# Altium schematic symbol library jlcpcb_2025_04_capacitors_extended_0603.schlib: 3668 symbols (part 8 of 20) (continued)
## CC0603FRNPO0BN120
designator C?  Capacitance: 12pF  (hidden comment: *)
Capacitor, Ceramic (MLCC), 12pF, ±1%, 100V, NP0, ±1%, SMD 0603; Manufacturer: YAGEO; Manufacturer Part Number: CC0603FRNPO0BN120; Package Size: 0603; JLCPCB Basic Part: No; JLCPCB Part Number: C576767; Supplier 1: LCSC; Category: Capacitors - MLCC; Supplier Part Number 1: C576767; Tolerance: ±1%; Voltage Rating: 100V; Temperature Coefficient: NP0; RoHS: Yes; ComponentLink1Description: Datasheet; ComponentLink1URL: https://wmsc.lcsc.com/wmsc/upload/file/pdf/v2/lcsc/2311211121_YAGEO-CC0603FRNPO0BN120_C576767.pdf; ComponentLink2Description: JLCPCB Part URL; ComponentLink2URL: https://jlcpcb.com/partdetail/C576767; ComponentLink3Description: LCSC Part URL; ComponentLink3URL: https://lcsc.com/product-detail/Multilayer-Ceramic-Capacitors-MLCC---SMD-SMT_YAGEO-YAGEO-CC0603FRNPO0BN120_C576767.html
footprint CAP-0603 (0603 (1608M) Capacitor)
pins: 1, 2

## CC0603FRNPO0BN121
designator C?  Capacitance: 120pF  (hidden comment: *)
Capacitor, Ceramic (MLCC), 120pF, ±1%, 100V, NP0, ±1%, SMD 0603; Manufacturer: YAGEO; Manufacturer Part Number: CC0603FRNPO0BN121; Package Size: 0603; JLCPCB Basic Part: No; JLCPCB Part Number: C576768; Supplier 1: LCSC; Category: Capacitors - MLCC; Supplier Part Number 1: C576768; Tolerance: ±1%; Voltage Rating: 100V; Temperature Coefficient: NP0; RoHS: Yes; ComponentLink1Description: Datasheet; ComponentLink1URL: https://wmsc.lcsc.com/wmsc/upload/file/pdf/v2/lcsc/2311211121_YAGEO-CC0603FRNPO0BN121_C576768.pdf; ComponentLink2Description: JLCPCB Part URL; ComponentLink2URL: https://jlcpcb.com/partdetail/C576768; ComponentLink3Description: LCSC Part URL; ComponentLink3URL: https://lcsc.com/product-detail/Multilayer-Ceramic-Capacitors-MLCC---SMD-SMT_YAGEO-YAGEO-CC0603FRNPO0BN121_C576768.html
footprint CAP-0603 (0603 (1608M) Capacitor)
pins: 1, 2

## CC0603FRNPO0BN150
designator C?  Capacitance: 15pF  (hidden comment: *)
Capacitor, Ceramic (MLCC), 15pF, ±1%, 100V, NP0, ±1%, SMD 0603; Manufacturer: YAGEO; Manufacturer Part Number: CC0603FRNPO0BN150; Package Size: 0603; JLCPCB Basic Part: No; JLCPCB Part Number: C527040; Supplier 1: LCSC; Category: Capacitors - MLCC; Supplier Part Number 1: C527040; Tolerance: ±1%; Voltage Rating: 100V; Temperature Coefficient: NP0; RoHS: Yes; ComponentLink1Description: Datasheet; ComponentLink1URL: https://wmsc.lcsc.com/wmsc/upload/file/pdf/v2/lcsc/2006181534_YAGEO-CC0603FRNPO0BN150_C527040.pdf; ComponentLink2Description: JLCPCB Part URL; ComponentLink2URL: https://jlcpcb.com/partdetail/C527040; ComponentLink3Description: LCSC Part URL; ComponentLink3URL: https://lcsc.com/product-detail/Multilayer-Ceramic-Capacitors-MLCC---SMD-SMT_YAGEO-YAGEO-CC0603FRNPO0BN150_C527040.html
footprint CAP-0603 (0603 (1608M) Capacitor)
pins: 1, 2

## CC0603FRNPO0BN151
designator C?  Capacitance: 150pF  (hidden comment: *)
Capacitor, Ceramic (MLCC), 150pF, ±1%, 100V, NP0, ±1%, SMD 0603; Manufacturer: YAGEO; Manufacturer Part Number: CC0603FRNPO0BN151; Package Size: 0603; JLCPCB Basic Part: No; JLCPCB Part Number: C527041; Supplier 1: LCSC; Category: Capacitors - MLCC; Supplier Part Number 1: C527041; Tolerance: ±1%; Voltage Rating: 100V; Temperature Coefficient: NP0; RoHS: Yes; ComponentLink1Description: Datasheet; ComponentLink1URL: https://wmsc.lcsc.com/wmsc/upload/file/pdf/v2/lcsc/2007021836_YAGEO-CC0603FRNPO0BN151_C527041.pdf; ComponentLink2Description: JLCPCB Part URL; ComponentLink2URL: https://jlcpcb.com/partdetail/C527041; ComponentLink3Description: LCSC Part URL; ComponentLink3URL: https://lcsc.com/product-detail/Multilayer-Ceramic-Capacitors-MLCC---SMD-SMT_YAGEO-YAGEO-CC0603FRNPO0BN151_C527041.html
footprint CAP-0603 (0603 (1608M) Capacitor)
pins: 1, 2

## CC0603FRNPO0BN180
designator C?  Capacitance: 18pF  (hidden comment: *)
Capacitor, Ceramic (MLCC), 18pF, ±1%, 100V, NP0, ±1%, SMD 0603; Manufacturer: YAGEO; Manufacturer Part Number: CC0603FRNPO0BN180; Package Size: 0603; JLCPCB Basic Part: No; JLCPCB Part Number: C576769; Supplier 1: LCSC; Category: Capacitors - MLCC; Supplier Part Number 1: C576769; Tolerance: ±1%; Voltage Rating: 100V; Temperature Coefficient: NP0; RoHS: Yes; ComponentLink1Description: Datasheet; ComponentLink1URL: https://wmsc.lcsc.com/wmsc/upload/file/pdf/v2/lcsc/2311211121_YAGEO-CC0603FRNPO0BN180_C576769.pdf; ComponentLink2Description: JLCPCB Part URL; ComponentLink2URL: https://jlcpcb.com/partdetail/C576769; ComponentLink3Description: LCSC Part URL; ComponentLink3URL: https://lcsc.com/product-detail/Multilayer-Ceramic-Capacitors-MLCC---SMD-SMT_YAGEO-YAGEO-CC0603FRNPO0BN180_C576769.html
footprint CAP-0603 (0603 (1608M) Capacitor)
pins: 1, 2

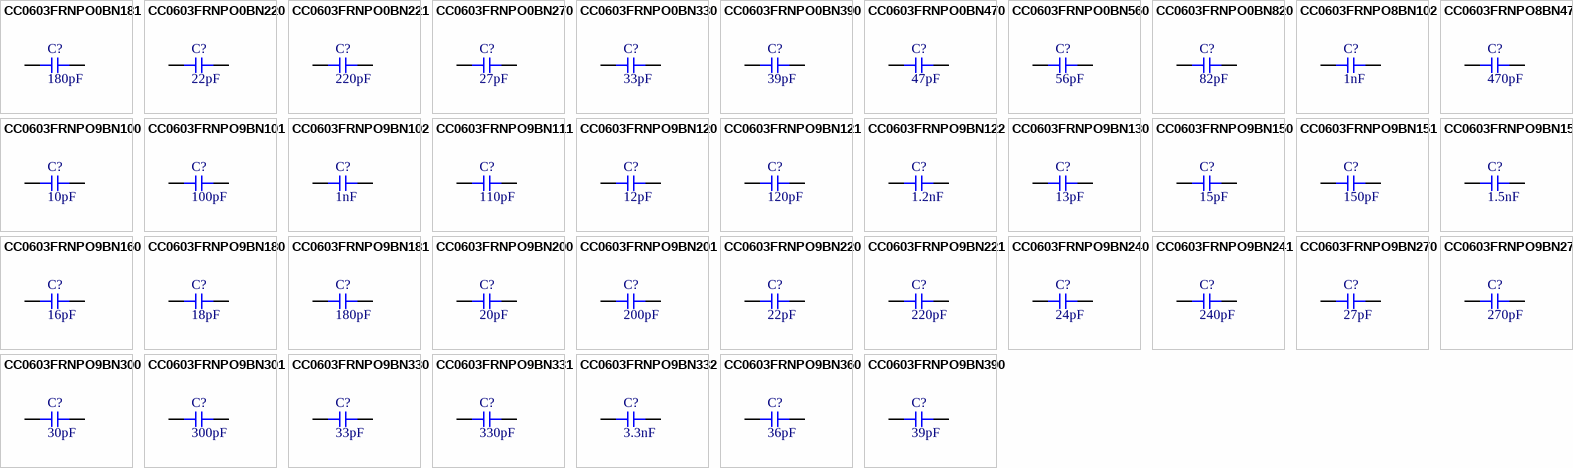
[diagram p36: symbols CC0603FRNPO0BN181 to CC0603FRNPO9BN390]

## CC0603FRNPO0BN181
designator C?  Capacitance: 180pF  (hidden comment: *)
Capacitor, Ceramic (MLCC), 180pF, ±1%, 100V, NP0, ±1%, SMD 0603; Manufacturer: YAGEO; Manufacturer Part Number: CC0603FRNPO0BN181; Package Size: 0603; JLCPCB Basic Part: No; JLCPCB Part Number: C576770; Supplier 1: LCSC; Category: Capacitors - MLCC; Supplier Part Number 1: C576770; Tolerance: ±1%; Voltage Rating: 100V; Temperature Coefficient: NP0; RoHS: Yes; ComponentLink1Description: Datasheet; ComponentLink1URL: https://wmsc.lcsc.com/wmsc/upload/file/pdf/v2/lcsc/2211141030_YAGEO-CC0603FRNPO0BN181_C576770.pdf; ComponentLink2Description: JLCPCB Part URL; ComponentLink2URL: https://jlcpcb.com/partdetail/C576770; ComponentLink3Description: LCSC Part URL; ComponentLink3URL: https://lcsc.com/product-detail/Multilayer-Ceramic-Capacitors-MLCC---SMD-SMT_YAGEO-YAGEO-CC0603FRNPO0BN181_C576770.html
footprint CAP-0603 (0603 (1608M) Capacitor)
pins: 1, 2

## CC0603FRNPO0BN220
designator C?  Capacitance: 22pF  (hidden comment: *)
Capacitor, Ceramic (MLCC), 22pF, ±1%, 100V, NP0, ±1%, SMD 0603; Manufacturer: YAGEO; Manufacturer Part Number: CC0603FRNPO0BN220; Package Size: 0603; JLCPCB Basic Part: No; JLCPCB Part Number: C527042; Supplier 1: LCSC; Category: Capacitors - MLCC; Supplier Part Number 1: C527042; Tolerance: ±1%; Voltage Rating: 100V; Temperature Coefficient: NP0; RoHS: Yes; ComponentLink1Description: Datasheet; ComponentLink1URL: https://wmsc.lcsc.com/wmsc/upload/file/pdf/v2/lcsc/2006181534_YAGEO-CC0603FRNPO0BN220_C527042.pdf; ComponentLink2Description: JLCPCB Part URL; ComponentLink2URL: https://jlcpcb.com/partdetail/C527042; ComponentLink3Description: LCSC Part URL; ComponentLink3URL: https://lcsc.com/product-detail/Multilayer-Ceramic-Capacitors-MLCC---SMD-SMT_YAGEO-YAGEO-CC0603FRNPO0BN220_C527042.html
footprint CAP-0603 (0603 (1608M) Capacitor)
pins: 1, 2

## CC0603FRNPO0BN221
designator C?  Capacitance: 220pF  (hidden comment: *)
Capacitor, Ceramic (MLCC), 220pF, ±1%, 100V, NP0, ±1%, SMD 0603; Manufacturer: YAGEO; Manufacturer Part Number: CC0603FRNPO0BN221; Package Size: 0603; JLCPCB Basic Part: No; JLCPCB Part Number: C576771; Supplier 1: LCSC; Category: Capacitors - MLCC; Supplier Part Number 1: C576771; Tolerance: ±1%; Voltage Rating: 100V; Temperature Coefficient: NP0; RoHS: Yes; ComponentLink1Description: Datasheet; ComponentLink1URL: https://wmsc.lcsc.com/wmsc/upload/file/pdf/v2/lcsc/2311211121_YAGEO-CC0603FRNPO0BN221_C576771.pdf; ComponentLink2Description: JLCPCB Part URL; ComponentLink2URL: https://jlcpcb.com/partdetail/C576771; ComponentLink3Description: LCSC Part URL; ComponentLink3URL: https://lcsc.com/product-detail/Multilayer-Ceramic-Capacitors-MLCC---SMD-SMT_YAGEO-YAGEO-CC0603FRNPO0BN221_C576771.html
footprint CAP-0603 (0603 (1608M) Capacitor)
pins: 1, 2

## CC0603FRNPO0BN270
designator C?  Capacitance: 27pF  (hidden comment: *)
Capacitor, Ceramic (MLCC), 27pF, ±1%, 100V, NP0, ±1%, SMD 0603; Manufacturer: YAGEO; Manufacturer Part Number: CC0603FRNPO0BN270; Package Size: 0603; JLCPCB Basic Part: No; JLCPCB Part Number: C576772; Supplier 1: LCSC; Category: Capacitors - MLCC; Supplier Part Number 1: C576772; Tolerance: ±1%; Voltage Rating: 100V; Temperature Coefficient: NP0; RoHS: Yes; ComponentLink1Description: Datasheet; ComponentLink1URL: https://wmsc.lcsc.com/wmsc/upload/file/pdf/v2/lcsc/2211141030_YAGEO-CC0603FRNPO0BN270_C576772.pdf; ComponentLink2Description: JLCPCB Part URL; ComponentLink2URL: https://jlcpcb.com/partdetail/C576772; ComponentLink3Description: LCSC Part URL; ComponentLink3URL: https://lcsc.com/product-detail/Multilayer-Ceramic-Capacitors-MLCC---SMD-SMT_YAGEO-YAGEO-CC0603FRNPO0BN270_C576772.html
footprint CAP-0603 (0603 (1608M) Capacitor)
pins: 1, 2

## CC0603FRNPO0BN330
designator C?  Capacitance: 33pF  (hidden comment: *)
Capacitor, Ceramic (MLCC), 33pF, ±1%, 100V, NP0, ±1%, SMD 0603; Manufacturer: YAGEO; Manufacturer Part Number: CC0603FRNPO0BN330; Package Size: 0603; JLCPCB Basic Part: No; JLCPCB Part Number: C527043; Supplier 1: LCSC; Category: Capacitors - MLCC; Supplier Part Number 1: C527043; Tolerance: ±1%; Voltage Rating: 100V; Temperature Coefficient: NP0; RoHS: Yes; ComponentLink1Description: Datasheet; ComponentLink1URL: https://wmsc.lcsc.com/wmsc/upload/file/pdf/v2/lcsc/2304140030_YAGEO-CC0603FRNPO0BN330_C527043.pdf; ComponentLink2Description: JLCPCB Part URL; ComponentLink2URL: https://jlcpcb.com/partdetail/C527043; ComponentLink3Description: LCSC Part URL; ComponentLink3URL: https://lcsc.com/product-detail/Multilayer-Ceramic-Capacitors-MLCC---SMD-SMT_YAGEO-YAGEO-CC0603FRNPO0BN330_C527043.html
footprint CAP-0603 (0603 (1608M) Capacitor)
pins: 1, 2

## CC0603FRNPO0BN390
designator C?  Capacitance: 39pF  (hidden comment: *)
Capacitor, Ceramic (MLCC), 39pF, ±1%, 100V, NP0, ±1%, SMD 0603; Manufacturer: YAGEO; Manufacturer Part Number: CC0603FRNPO0BN390; Package Size: 0603; JLCPCB Basic Part: No; JLCPCB Part Number: C576774; Supplier 1: LCSC; Category: Capacitors - MLCC; Supplier Part Number 1: C576774; Tolerance: ±1%; Voltage Rating: 100V; Temperature Coefficient: NP0; RoHS: Yes; ComponentLink1Description: Datasheet; ComponentLink1URL: https://wmsc.lcsc.com/wmsc/upload/file/pdf/v2/lcsc/2303021100_YAGEO-CC0603FRNPO0BN390_C576774.pdf; ComponentLink2Description: JLCPCB Part URL; ComponentLink2URL: https://jlcpcb.com/partdetail/C576774; ComponentLink3Description: LCSC Part URL; ComponentLink3URL: https://lcsc.com/product-detail/Multilayer-Ceramic-Capacitors-MLCC---SMD-SMT_YAGEO-YAGEO-CC0603FRNPO0BN390_C576774.html
footprint CAP-0603 (0603 (1608M) Capacitor)
pins: 1, 2

## CC0603FRNPO0BN470
designator C?  Capacitance: 47pF  (hidden comment: *)
Capacitor, Ceramic (MLCC), 47pF, ±1%, 100V, NP0, ±1%, SMD 0603; Manufacturer: YAGEO; Manufacturer Part Number: CC0603FRNPO0BN470; Package Size: 0603; JLCPCB Basic Part: No; JLCPCB Part Number: C527044; Supplier 1: LCSC; Category: Capacitors - MLCC; Supplier Part Number 1: C527044; Tolerance: ±1%; Voltage Rating: 100V; Temperature Coefficient: NP0; RoHS: Yes; ComponentLink1Description: Datasheet; ComponentLink1URL: https://wmsc.lcsc.com/wmsc/upload/file/pdf/v2/lcsc/2006101834_YAGEO-CC0603FRNPO0BN470_C527044.pdf; ComponentLink2Description: JLCPCB Part URL; ComponentLink2URL: https://jlcpcb.com/partdetail/C527044; ComponentLink3Description: LCSC Part URL; ComponentLink3URL: https://lcsc.com/product-detail/Multilayer-Ceramic-Capacitors-MLCC---SMD-SMT_YAGEO-YAGEO-CC0603FRNPO0BN470_C527044.html
footprint CAP-0603 (0603 (1608M) Capacitor)
pins: 1, 2

## CC0603FRNPO0BN560
designator C?  Capacitance: 56pF  (hidden comment: *)
Capacitor, Ceramic (MLCC), 56pF, ±1%, 100V, NP0, ±1%, SMD 0603; Manufacturer: YAGEO; Manufacturer Part Number: CC0603FRNPO0BN560; Package Size: 0603; JLCPCB Basic Part: No; JLCPCB Part Number: C576775; Supplier 1: LCSC; Category: Capacitors - MLCC; Supplier Part Number 1: C576775; Tolerance: ±1%; Voltage Rating: 100V; Temperature Coefficient: NP0; RoHS: Yes; ComponentLink1Description: Datasheet; ComponentLink1URL: https://wmsc.lcsc.com/wmsc/upload/file/pdf/v2/lcsc/2311211121_YAGEO-CC0603FRNPO0BN560_C576775.pdf; ComponentLink2Description: JLCPCB Part URL; ComponentLink2URL: https://jlcpcb.com/partdetail/C576775; ComponentLink3Description: LCSC Part URL; ComponentLink3URL: https://lcsc.com/product-detail/Multilayer-Ceramic-Capacitors-MLCC---SMD-SMT_YAGEO-YAGEO-CC0603FRNPO0BN560_C576775.html
footprint CAP-0603 (0603 (1608M) Capacitor)
pins: 1, 2

## CC0603FRNPO0BN820
designator C?  Capacitance: 82pF  (hidden comment: *)
Capacitor, Ceramic (MLCC), 82pF, ±1%, 100V, NP0, ±1%, SMD 0603; Manufacturer: YAGEO; Manufacturer Part Number: CC0603FRNPO0BN820; Package Size: 0603; JLCPCB Basic Part: No; JLCPCB Part Number: C576777; Supplier 1: LCSC; Category: Capacitors - MLCC; Supplier Part Number 1: C576777; Tolerance: ±1%; Voltage Rating: 100V; Temperature Coefficient: NP0; RoHS: Yes; ComponentLink1Description: Datasheet; ComponentLink1URL: https://wmsc.lcsc.com/wmsc/upload/file/pdf/v2/lcsc/2311211121_YAGEO-CC0603FRNPO0BN820_C576777.pdf; ComponentLink2Description: JLCPCB Part URL; ComponentLink2URL: https://jlcpcb.com/partdetail/C576777; ComponentLink3Description: LCSC Part URL; ComponentLink3URL: https://lcsc.com/product-detail/Multilayer-Ceramic-Capacitors-MLCC---SMD-SMT_YAGEO-YAGEO-CC0603FRNPO0BN820_C576777.html
footprint CAP-0603 (0603 (1608M) Capacitor)
pins: 1, 2

## CC0603FRNPO8BN102
designator C?  Capacitance: 1nF  (hidden comment: *)
Capacitor, Ceramic (MLCC), 1nF, ±1%, 25V, NP0, ±1%, SMD 0603; Manufacturer: YAGEO; Manufacturer Part Number: CC0603FRNPO8BN102; Package Size: 0603; JLCPCB Basic Part: No; JLCPCB Part Number: C519573; Supplier 1: LCSC; Category: Capacitors - MLCC; Supplier Part Number 1: C519573; Tolerance: ±1%; Voltage Rating: 25V; Temperature Coefficient: NP0; RoHS: Yes; ComponentLink1Description: Datasheet; ComponentLink1URL: https://wmsc.lcsc.com/wmsc/upload/file/pdf/v2/lcsc/2005181835_YAGEO-CC0603FRNPO8BN102_C519573.pdf; ComponentLink2Description: JLCPCB Part URL; ComponentLink2URL: https://jlcpcb.com/partdetail/C519573; ComponentLink3Description: LCSC Part URL; ComponentLink3URL: https://lcsc.com/product-detail/Multilayer-Ceramic-Capacitors-MLCC---SMD-SMT_YAGEO-YAGEO-CC0603FRNPO8BN102_C519573.html
footprint CAP-0603 (0603 (1608M) Capacitor)
pins: 1, 2

## CC0603FRNPO8BN471
designator C?  Capacitance: 470pF  (hidden comment: *)
Capacitor, Ceramic (MLCC), 470pF, ±1%, 25V, NP0, ±1%, SMD 0603; Manufacturer: YAGEO; Manufacturer Part Number: CC0603FRNPO8BN471; Package Size: 0603; JLCPCB Basic Part: No; JLCPCB Part Number: C1853040; Supplier 1: LCSC; Category: Capacitors - MLCC; Supplier Part Number 1: C1853040; Tolerance: ±1%; Voltage Rating: 25V; Temperature Coefficient: NP0; RoHS: Yes; ComponentLink1Description: Datasheet; ComponentLink1URL: https://wmsc.lcsc.com/wmsc/upload/file/pdf/v2/lcsc/2201271030_YAGEO-CC0603FRNPO8BN471_C1853040.pdf; ComponentLink2Description: JLCPCB Part URL; ComponentLink2URL: https://jlcpcb.com/partdetail/C1853040; ComponentLink3Description: LCSC Part URL; ComponentLink3URL: https://lcsc.com/product-detail/Multilayer-Ceramic-Capacitors-MLCC---SMD-SMT_YAGEO-YAGEO-CC0603FRNPO8BN471_C1853040.html
footprint CAP-0603 (0603 (1608M) Capacitor)
pins: 1, 2

## CC0603FRNPO9BN100
designator C?  Capacitance: 10pF  (hidden comment: *)
Capacitor, Ceramic (MLCC), 10pF, ±1%, 50V, NP0, ±1%, SMD 0603; Manufacturer: YAGEO; Manufacturer Part Number: CC0603FRNPO9BN100; Package Size: 0603; JLCPCB Basic Part: No; JLCPCB Part Number: C309467; Supplier 1: LCSC; Category: Capacitors - MLCC; Supplier Part Number 1: C309467; Tolerance: ±1%; Voltage Rating: 50V; Temperature Coefficient: NP0; RoHS: Yes; ComponentLink1Description: Datasheet; ComponentLink1URL: https://wmsc.lcsc.com/wmsc/upload/file/pdf/v2/lcsc/2304140030_YAGEO-CC0603FRNPO9BN100_C309467.pdf; ComponentLink2Description: JLCPCB Part URL; ComponentLink2URL: https://jlcpcb.com/partdetail/C309467; ComponentLink3Description: LCSC Part URL; ComponentLink3URL: https://lcsc.com/product-detail/Multilayer-Ceramic-Capacitors-MLCC---SMD-SMT_YAGEO-YAGEO-CC0603FRNPO9BN100_C309467.html
footprint CAP-0603 (0603 (1608M) Capacitor)
pins: 1, 2

## CC0603FRNPO9BN101
designator C?  Capacitance: 100pF  (hidden comment: *)
Capacitor, Ceramic (MLCC), 100pF, ±1%, 50V, NP0, ±1%, SMD 0603; Manufacturer: YAGEO; Manufacturer Part Number: CC0603FRNPO9BN101; Package Size: 0603; JLCPCB Basic Part: No; JLCPCB Part Number: C513648; Supplier 1: LCSC; Category: Capacitors - MLCC; Supplier Part Number 1: C513648; Tolerance: ±1%; Voltage Rating: 50V; Temperature Coefficient: NP0; RoHS: Yes; ComponentLink1Description: Datasheet; ComponentLink1URL: https://wmsc.lcsc.com/wmsc/upload/file/pdf/v2/lcsc/2004231433_YAGEO-CC0603FRNPO9BN101_C513648.pdf; ComponentLink2Description: JLCPCB Part URL; ComponentLink2URL: https://jlcpcb.com/partdetail/C513648; ComponentLink3Description: LCSC Part URL; ComponentLink3URL: https://lcsc.com/product-detail/Multilayer-Ceramic-Capacitors-MLCC---SMD-SMT_YAGEO-YAGEO-CC0603FRNPO9BN101_C513648.html
footprint CAP-0603 (0603 (1608M) Capacitor)
pins: 1, 2

## CC0603FRNPO9BN102
designator C?  Capacitance: 1nF  (hidden comment: *)
Capacitor, Ceramic (MLCC), 1nF, ±1%, 50V, NP0, ±1%, SMD 0603; Manufacturer: YAGEO; Manufacturer Part Number: CC0603FRNPO9BN102; Package Size: 0603; JLCPCB Basic Part: No; JLCPCB Part Number: C309468; Supplier 1: LCSC; Category: Capacitors - MLCC; Supplier Part Number 1: C309468; Tolerance: ±1%; Voltage Rating: 50V; Temperature Coefficient: NP0; RoHS: Yes; ComponentLink1Description: Datasheet; ComponentLink1URL: https://wmsc.lcsc.com/wmsc/upload/file/pdf/v2/lcsc/2304140030_YAGEO-CC0603FRNPO9BN102_C309468.pdf; ComponentLink2Description: JLCPCB Part URL; ComponentLink2URL: https://jlcpcb.com/partdetail/C309468; ComponentLink3Description: LCSC Part URL; ComponentLink3URL: https://lcsc.com/product-detail/Multilayer-Ceramic-Capacitors-MLCC---SMD-SMT_YAGEO-YAGEO-CC0603FRNPO9BN102_C309468.html
footprint CAP-0603 (0603 (1608M) Capacitor)
pins: 1, 2

## CC0603FRNPO9BN111
designator C?  Capacitance: 110pF  (hidden comment: *)
Capacitor, Ceramic (MLCC), 110pF, ±1%, 50V, NP0, ±1%, SMD 0603; Manufacturer: YAGEO; Manufacturer Part Number: CC0603FRNPO9BN111; Package Size: 0603; JLCPCB Basic Part: No; JLCPCB Part Number: C519568; Supplier 1: LCSC; Category: Capacitors - MLCC; Supplier Part Number 1: C519568; Tolerance: ±1%; Voltage Rating: 50V; Temperature Coefficient: NP0; RoHS: Yes; ComponentLink1Description: Datasheet; ComponentLink1URL: https://wmsc.lcsc.com/wmsc/upload/file/pdf/v2/lcsc/2008051835_YAGEO-CC0603FRNPO9BN111_C519568.pdf; ComponentLink2Description: JLCPCB Part URL; ComponentLink2URL: https://jlcpcb.com/partdetail/C519568; ComponentLink3Description: LCSC Part URL; ComponentLink3URL: https://lcsc.com/product-detail/Multilayer-Ceramic-Capacitors-MLCC---SMD-SMT_YAGEO-YAGEO-CC0603FRNPO9BN111_C519568.html
footprint CAP-0603 (0603 (1608M) Capacitor)
pins: 1, 2

## CC0603FRNPO9BN120
designator C?  Capacitance: 12pF  (hidden comment: *)
Capacitor, Ceramic (MLCC), 12pF, ±1%, 50V, NP0, ±1%, SMD 0603; Manufacturer: YAGEO; Manufacturer Part Number: CC0603FRNPO9BN120; Package Size: 0603; JLCPCB Basic Part: No; JLCPCB Part Number: C519482; Supplier 1: LCSC; Category: Capacitors - MLCC; Supplier Part Number 1: C519482; Tolerance: ±1%; Voltage Rating: 50V; Temperature Coefficient: NP0; RoHS: Yes; ComponentLink1Description: Datasheet; ComponentLink1URL: https://wmsc.lcsc.com/wmsc/upload/file/pdf/v2/lcsc/2005141203_YAGEO-CC0603FRNPO9BN120_C519482.pdf; ComponentLink2Description: JLCPCB Part URL; ComponentLink2URL: https://jlcpcb.com/partdetail/C519482; ComponentLink3Description: LCSC Part URL; ComponentLink3URL: https://lcsc.com/product-detail/Multilayer-Ceramic-Capacitors-MLCC---SMD-SMT_YAGEO-YAGEO-CC0603FRNPO9BN120_C519482.html
footprint CAP-0603 (0603 (1608M) Capacitor)
pins: 1, 2

## CC0603FRNPO9BN121
designator C?  Capacitance: 120pF  (hidden comment: *)
Capacitor, Ceramic (MLCC), 120pF, ±1%, 50V, NP0, ±1%, SMD 0603; Manufacturer: YAGEO; Manufacturer Part Number: CC0603FRNPO9BN121; Package Size: 0603; JLCPCB Basic Part: No; JLCPCB Part Number: C519498; Supplier 1: LCSC; Category: Capacitors - MLCC; Supplier Part Number 1: C519498; Tolerance: ±1%; Voltage Rating: 50V; Temperature Coefficient: NP0; RoHS: Yes; ComponentLink1Description: Datasheet; ComponentLink1URL: https://wmsc.lcsc.com/wmsc/upload/file/pdf/v2/lcsc/2006011835_YAGEO-CC0603FRNPO9BN121_C519498.pdf; ComponentLink2Description: JLCPCB Part URL; ComponentLink2URL: https://jlcpcb.com/partdetail/C519498; ComponentLink3Description: LCSC Part URL; ComponentLink3URL: https://lcsc.com/product-detail/Multilayer-Ceramic-Capacitors-MLCC---SMD-SMT_YAGEO-YAGEO-CC0603FRNPO9BN121_C519498.html
footprint CAP-0603 (0603 (1608M) Capacitor)
pins: 1, 2

## CC0603FRNPO9BN122
designator C?  Capacitance: 1.2nF  (hidden comment: *)
Capacitor, Ceramic (MLCC), 1.2nF, ±1%, 50V, NP0, ±1%, SMD 0603; Manufacturer: YAGEO; Manufacturer Part Number: CC0603FRNPO9BN122; Package Size: 0603; JLCPCB Basic Part: No; JLCPCB Part Number: C1853470; Supplier 1: LCSC; Category: Capacitors - MLCC; Supplier Part Number 1: C1853470; Tolerance: ±1%; Voltage Rating: 50V; Temperature Coefficient: NP0; RoHS: Yes; ComponentLink1Description: Datasheet; ComponentLink1URL: https://wmsc.lcsc.com/wmsc/upload/file/pdf/v2/lcsc/2201271100_YAGEO-CC0603FRNPO9BN122_C1853470.pdf; ComponentLink2Description: JLCPCB Part URL; ComponentLink2URL: https://jlcpcb.com/partdetail/C1853470; ComponentLink3Description: LCSC Part URL; ComponentLink3URL: https://lcsc.com/product-detail/Multilayer-Ceramic-Capacitors-MLCC---SMD-SMT_YAGEO-YAGEO-CC0603FRNPO9BN122_C1853470.html
footprint CAP-0603 (0603 (1608M) Capacitor)
pins: 1, 2

## CC0603FRNPO9BN130
designator C?  Capacitance: 13pF  (hidden comment: *)
Capacitor, Ceramic (MLCC), 13pF, ±1%, 50V, NP0, ±1%, SMD 0603; Manufacturer: YAGEO; Manufacturer Part Number: CC0603FRNPO9BN130; Package Size: 0603; JLCPCB Basic Part: No; JLCPCB Part Number: C519488; Supplier 1: LCSC; Category: Capacitors - MLCC; Supplier Part Number 1: C519488; Tolerance: ±1%; Voltage Rating: 50V; Temperature Coefficient: NP0; RoHS: Yes; ComponentLink1Description: Datasheet; ComponentLink1URL: https://wmsc.lcsc.com/wmsc/upload/file/pdf/v2/lcsc/2010251434_YAGEO-CC0603FRNPO9BN130_C519488.pdf; ComponentLink2Description: JLCPCB Part URL; ComponentLink2URL: https://jlcpcb.com/partdetail/C519488; ComponentLink3Description: LCSC Part URL; ComponentLink3URL: https://lcsc.com/product-detail/Multilayer-Ceramic-Capacitors-MLCC---SMD-SMT_YAGEO-YAGEO-CC0603FRNPO9BN130_C519488.html
footprint CAP-0603 (0603 (1608M) Capacitor)
pins: 1, 2

## CC0603FRNPO9BN150
designator C?  Capacitance: 15pF  (hidden comment: *)
Capacitor, Ceramic (MLCC), 15pF, ±1%, 50V, NP0, ±1%, SMD 0603; Manufacturer: YAGEO; Manufacturer Part Number: CC0603FRNPO9BN150; Package Size: 0603; JLCPCB Basic Part: No; JLCPCB Part Number: C519483; Supplier 1: LCSC; Category: Capacitors - MLCC; Supplier Part Number 1: C519483; Tolerance: ±1%; Voltage Rating: 50V; Temperature Coefficient: NP0; RoHS: Yes; ComponentLink1Description: Datasheet; ComponentLink1URL: https://wmsc.lcsc.com/wmsc/upload/file/pdf/v2/lcsc/2005141203_YAGEO-CC0603FRNPO9BN150_C519483.pdf; ComponentLink2Description: JLCPCB Part URL; ComponentLink2URL: https://jlcpcb.com/partdetail/C519483; ComponentLink3Description: LCSC Part URL; ComponentLink3URL: https://lcsc.com/product-detail/Multilayer-Ceramic-Capacitors-MLCC---SMD-SMT_YAGEO-YAGEO-CC0603FRNPO9BN150_C519483.html
footprint CAP-0603 (0603 (1608M) Capacitor)
pins: 1, 2

## CC0603FRNPO9BN151
designator C?  Capacitance: 150pF  (hidden comment: *)
Capacitor, Ceramic (MLCC), 150pF, ±1%, 50V, NP0, ±1%, SMD 0603; Manufacturer: YAGEO; Manufacturer Part Number: CC0603FRNPO9BN151; Package Size: 0603; JLCPCB Basic Part: No; JLCPCB Part Number: C519499; Supplier 1: LCSC; Category: Capacitors - MLCC; Supplier Part Number 1: C519499; Tolerance: ±1%; Voltage Rating: 50V; Temperature Coefficient: NP0; RoHS: Yes; ComponentLink1Description: Datasheet; ComponentLink1URL: https://wmsc.lcsc.com/wmsc/upload/file/pdf/v2/lcsc/2007231533_YAGEO-CC0603FRNPO9BN151_C519499.pdf; ComponentLink2Description: JLCPCB Part URL; ComponentLink2URL: https://jlcpcb.com/partdetail/C519499; ComponentLink3Description: LCSC Part URL; ComponentLink3URL: https://lcsc.com/product-detail/Multilayer-Ceramic-Capacitors-MLCC---SMD-SMT_YAGEO-YAGEO-CC0603FRNPO9BN151_C519499.html
footprint CAP-0603 (0603 (1608M) Capacitor)
pins: 1, 2

## CC0603FRNPO9BN152
designator C?  Capacitance: 1.5nF  (hidden comment: *)
Capacitor, Ceramic (MLCC), 1.5nF, ±1%, 50V, NP0, ±1%, SMD 0603; Manufacturer: YAGEO; Manufacturer Part Number: CC0603FRNPO9BN152; Package Size: 0603; JLCPCB Basic Part: No; JLCPCB Part Number: C576779; Supplier 1: LCSC; Category: Capacitors - MLCC; Supplier Part Number 1: C576779; Tolerance: ±1%; Voltage Rating: 50V; Temperature Coefficient: NP0; RoHS: Yes; ComponentLink1Description: Datasheet; ComponentLink1URL: https://wmsc.lcsc.com/wmsc/upload/file/pdf/v2/lcsc/2204271615_YAGEO-CC0603FRNPO9BN152_C576779.pdf; ComponentLink2Description: JLCPCB Part URL; ComponentLink2URL: https://jlcpcb.com/partdetail/C576779; ComponentLink3Description: LCSC Part URL; ComponentLink3URL: https://lcsc.com/product-detail/Multilayer-Ceramic-Capacitors-MLCC---SMD-SMT_YAGEO-YAGEO-CC0603FRNPO9BN152_C576779.html
footprint CAP-0603 (0603 (1608M) Capacitor)
pins: 1, 2

## CC0603FRNPO9BN160
designator C?  Capacitance: 16pF  (hidden comment: *)
Capacitor, Ceramic (MLCC), 16pF, ±1%, 50V, NP0, ±1%, SMD 0603; Manufacturer: YAGEO; Manufacturer Part Number: CC0603FRNPO9BN160; Package Size: 0603; JLCPCB Basic Part: No; JLCPCB Part Number: C519489; Supplier 1: LCSC; Category: Capacitors - MLCC; Supplier Part Number 1: C519489; Tolerance: ±1%; Voltage Rating: 50V; Temperature Coefficient: NP0; RoHS: Yes; ComponentLink1Description: Datasheet; ComponentLink1URL: https://wmsc.lcsc.com/wmsc/upload/file/pdf/v2/lcsc/2007161234_YAGEO-CC0603FRNPO9BN160_C519489.pdf; ComponentLink2Description: JLCPCB Part URL; ComponentLink2URL: https://jlcpcb.com/partdetail/C519489; ComponentLink3Description: LCSC Part URL; ComponentLink3URL: https://lcsc.com/product-detail/Multilayer-Ceramic-Capacitors-MLCC---SMD-SMT_YAGEO-YAGEO-CC0603FRNPO9BN160_C519489.html
footprint CAP-0603 (0603 (1608M) Capacitor)
pins: 1, 2

## CC0603FRNPO9BN180
designator C?  Capacitance: 18pF  (hidden comment: *)
Capacitor, Ceramic (MLCC), 18pF, ±1%, 50V, NP0, ±1%, SMD 0603; Manufacturer: YAGEO; Manufacturer Part Number: CC0603FRNPO9BN180; Package Size: 0603; JLCPCB Basic Part: No; JLCPCB Part Number: C527046; Supplier 1: LCSC; Category: Capacitors - MLCC; Supplier Part Number 1: C527046; Tolerance: ±1%; Voltage Rating: 50V; Temperature Coefficient: NP0; RoHS: Yes; ComponentLink1Description: Datasheet; ComponentLink1URL: https://wmsc.lcsc.com/wmsc/upload/file/pdf/v2/lcsc/2006181535_YAGEO-CC0603FRNPO9BN180_C527046.pdf; ComponentLink2Description: JLCPCB Part URL; ComponentLink2URL: https://jlcpcb.com/partdetail/C527046; ComponentLink3Description: LCSC Part URL; ComponentLink3URL: https://lcsc.com/product-detail/Multilayer-Ceramic-Capacitors-MLCC---SMD-SMT_YAGEO-YAGEO-CC0603FRNPO9BN180_C527046.html
footprint CAP-0603 (0603 (1608M) Capacitor)
pins: 1, 2

## CC0603FRNPO9BN181
designator C?  Capacitance: 180pF  (hidden comment: *)
Capacitor, Ceramic (MLCC), 180pF, ±1%, 50V, NP0, ±1%, SMD 0603; Manufacturer: YAGEO; Manufacturer Part Number: CC0603FRNPO9BN181; Package Size: 0603; JLCPCB Basic Part: No; JLCPCB Part Number: C527047; Supplier 1: LCSC; Category: Capacitors - MLCC; Supplier Part Number 1: C527047; Tolerance: ±1%; Voltage Rating: 50V; Temperature Coefficient: NP0; RoHS: Yes; ComponentLink1Description: Datasheet; ComponentLink1URL: https://wmsc.lcsc.com/wmsc/upload/file/pdf/v2/lcsc/2005222139_YAGEO-CC0603FRNPO9BN181_C527047.pdf; ComponentLink2Description: JLCPCB Part URL; ComponentLink2URL: https://jlcpcb.com/partdetail/C527047; ComponentLink3Description: LCSC Part URL; ComponentLink3URL: https://lcsc.com/product-detail/Multilayer-Ceramic-Capacitors-MLCC---SMD-SMT_YAGEO-YAGEO-CC0603FRNPO9BN181_C527047.html
footprint CAP-0603 (0603 (1608M) Capacitor)
pins: 1, 2

## CC0603FRNPO9BN200
designator C?  Capacitance: 20pF  (hidden comment: *)
Capacitor, Ceramic (MLCC), 20pF, ±1%, 50V, NP0, ±1%, SMD 0603; Manufacturer: YAGEO; Manufacturer Part Number: CC0603FRNPO9BN200; Package Size: 0603; JLCPCB Basic Part: No; JLCPCB Part Number: C326779; Supplier 1: LCSC; Category: Capacitors - MLCC; Supplier Part Number 1: C326779; Tolerance: ±1%; Voltage Rating: 50V; Temperature Coefficient: NP0; RoHS: Yes; ComponentLink1Description: Datasheet; ComponentLink1URL: https://wmsc.lcsc.com/wmsc/upload/file/pdf/v2/lcsc/1811141353_YAGEO-CC0603FRNPO9BN200_C326779.pdf; ComponentLink2Description: JLCPCB Part URL; ComponentLink2URL: https://jlcpcb.com/partdetail/C326779; ComponentLink3Description: LCSC Part URL; ComponentLink3URL: https://lcsc.com/product-detail/Multilayer-Ceramic-Capacitors-MLCC---SMD-SMT_YAGEO-YAGEO-CC0603FRNPO9BN200_C326779.html
footprint CAP-0603 (0603 (1608M) Capacitor)
pins: 1, 2

## CC0603FRNPO9BN201
designator C?  Capacitance: 200pF  (hidden comment: *)
Capacitor, Ceramic (MLCC), 200pF, ±1%, 50V, NP0, ±1%, SMD 0603; Manufacturer: YAGEO; Manufacturer Part Number: CC0603FRNPO9BN201; Package Size: 0603; JLCPCB Basic Part: No; JLCPCB Part Number: C519569; Supplier 1: LCSC; Category: Capacitors - MLCC; Supplier Part Number 1: C519569; Tolerance: ±1%; Voltage Rating: 50V; Temperature Coefficient: NP0; RoHS: Yes; ComponentLink1Description: Datasheet; ComponentLink1URL: https://wmsc.lcsc.com/wmsc/upload/file/pdf/v2/lcsc/2007161234_YAGEO-CC0603FRNPO9BN201_C519569.pdf; ComponentLink2Description: JLCPCB Part URL; ComponentLink2URL: https://jlcpcb.com/partdetail/C519569; ComponentLink3Description: LCSC Part URL; ComponentLink3URL: https://lcsc.com/product-detail/Multilayer-Ceramic-Capacitors-MLCC---SMD-SMT_YAGEO-YAGEO-CC0603FRNPO9BN201_C519569.html
footprint CAP-0603 (0603 (1608M) Capacitor)
pins: 1, 2

## CC0603FRNPO9BN220
designator C?  Capacitance: 22pF  (hidden comment: *)
Capacitor, Ceramic (MLCC), 22pF, ±1%, 50V, NP0, ±1%, SMD 0603; Manufacturer: YAGEO; Manufacturer Part Number: CC0603FRNPO9BN220; Package Size: 0603; JLCPCB Basic Part: No; JLCPCB Part Number: C326840; Supplier 1: LCSC; Category: Capacitors - MLCC; Supplier Part Number 1: C326840; Tolerance: ±1%; Voltage Rating: 50V; Temperature Coefficient: NP0; RoHS: Yes; ComponentLink1Description: Datasheet; ComponentLink1URL: https://wmsc.lcsc.com/wmsc/upload/file/pdf/v2/lcsc/2304140030_YAGEO-CC0603FRNPO9BN220_C326840.pdf; ComponentLink2Description: JLCPCB Part URL; ComponentLink2URL: https://jlcpcb.com/partdetail/C326840; ComponentLink3Description: LCSC Part URL; ComponentLink3URL: https://lcsc.com/product-detail/Multilayer-Ceramic-Capacitors-MLCC---SMD-SMT_YAGEO-YAGEO-CC0603FRNPO9BN220_C326840.html
footprint CAP-0603 (0603 (1608M) Capacitor)
pins: 1, 2

## CC0603FRNPO9BN221
designator C?  Capacitance: 220pF  (hidden comment: *)
Capacitor, Ceramic (MLCC), 220pF, ±1%, 50V, NP0, ±1%, SMD 0603; Manufacturer: YAGEO; Manufacturer Part Number: CC0603FRNPO9BN221; Package Size: 0603; JLCPCB Basic Part: No; JLCPCB Part Number: C519500; Supplier 1: LCSC; Category: Capacitors - MLCC; Supplier Part Number 1: C519500; Tolerance: ±1%; Voltage Rating: 50V; Temperature Coefficient: NP0; RoHS: Yes; ComponentLink1Description: Datasheet; ComponentLink1URL: https://wmsc.lcsc.com/wmsc/upload/file/pdf/v2/lcsc/2007161234_YAGEO-CC0603FRNPO9BN221_C519500.pdf; ComponentLink2Description: JLCPCB Part URL; ComponentLink2URL: https://jlcpcb.com/partdetail/C519500; ComponentLink3Description: LCSC Part URL; ComponentLink3URL: https://lcsc.com/product-detail/Multilayer-Ceramic-Capacitors-MLCC---SMD-SMT_YAGEO-YAGEO-CC0603FRNPO9BN221_C519500.html
footprint CAP-0603 (0603 (1608M) Capacitor)
pins: 1, 2

## CC0603FRNPO9BN240
designator C?  Capacitance: 24pF  (hidden comment: *)
Capacitor, Ceramic (MLCC), 24pF, ±1%, 50V, NP0, ±1%, SMD 0603; Manufacturer: YAGEO; Manufacturer Part Number: CC0603FRNPO9BN240; Package Size: 0603; JLCPCB Basic Part: No; JLCPCB Part Number: C519490; Supplier 1: LCSC; Category: Capacitors - MLCC; Supplier Part Number 1: C519490; Tolerance: ±1%; Voltage Rating: 50V; Temperature Coefficient: NP0; RoHS: Yes; ComponentLink1Description: Datasheet; ComponentLink1URL: https://wmsc.lcsc.com/wmsc/upload/file/pdf/v2/lcsc/2008191833_YAGEO-CC0603FRNPO9BN240_C519490.pdf; ComponentLink2Description: JLCPCB Part URL; ComponentLink2URL: https://jlcpcb.com/partdetail/C519490; ComponentLink3Description: LCSC Part URL; ComponentLink3URL: https://lcsc.com/product-detail/Multilayer-Ceramic-Capacitors-MLCC---SMD-SMT_YAGEO-YAGEO-CC0603FRNPO9BN240_C519490.html
footprint CAP-0603 (0603 (1608M) Capacitor)
pins: 1, 2

## CC0603FRNPO9BN241
designator C?  Capacitance: 240pF  (hidden comment: *)
Capacitor, Ceramic (MLCC), 240pF, ±1%, 50V, NP0, ±1%, SMD 0603; Manufacturer: YAGEO; Manufacturer Part Number: CC0603FRNPO9BN241; Package Size: 0603; JLCPCB Basic Part: No; JLCPCB Part Number: C519570; Supplier 1: LCSC; Category: Capacitors - MLCC; Supplier Part Number 1: C519570; Tolerance: ±1%; Voltage Rating: 50V; Temperature Coefficient: NP0; RoHS: Yes; ComponentLink1Description: Datasheet; ComponentLink1URL: https://wmsc.lcsc.com/wmsc/upload/file/pdf/v2/lcsc/2007231534_YAGEO-CC0603FRNPO9BN241_C519570.pdf; ComponentLink2Description: JLCPCB Part URL; ComponentLink2URL: https://jlcpcb.com/partdetail/C519570; ComponentLink3Description: LCSC Part URL; ComponentLink3URL: https://lcsc.com/product-detail/Multilayer-Ceramic-Capacitors-MLCC---SMD-SMT_YAGEO-YAGEO-CC0603FRNPO9BN241_C519570.html
footprint CAP-0603 (0603 (1608M) Capacitor)
pins: 1, 2

## CC0603FRNPO9BN270
designator C?  Capacitance: 27pF  (hidden comment: *)
Capacitor, Ceramic (MLCC), 27pF, ±1%, 50V, NP0, ±1%, SMD 0603; Manufacturer: YAGEO; Manufacturer Part Number: CC0603FRNPO9BN270; Package Size: 0603; JLCPCB Basic Part: No; JLCPCB Part Number: C519484; Supplier 1: LCSC; Category: Capacitors - MLCC; Supplier Part Number 1: C519484; Tolerance: ±1%; Voltage Rating: 50V; Temperature Coefficient: NP0; RoHS: Yes; ComponentLink1Description: Datasheet; ComponentLink1URL: https://wmsc.lcsc.com/wmsc/upload/file/pdf/v2/lcsc/2006011835_YAGEO-CC0603FRNPO9BN270_C519484.pdf; ComponentLink2Description: JLCPCB Part URL; ComponentLink2URL: https://jlcpcb.com/partdetail/C519484; ComponentLink3Description: LCSC Part URL; ComponentLink3URL: https://lcsc.com/product-detail/Multilayer-Ceramic-Capacitors-MLCC---SMD-SMT_YAGEO-YAGEO-CC0603FRNPO9BN270_C519484.html
footprint CAP-0603 (0603 (1608M) Capacitor)
pins: 1, 2

## CC0603FRNPO9BN271
designator C?  Capacitance: 270pF  (hidden comment: *)
Capacitor, Ceramic (MLCC), 270pF, ±1%, 50V, NP0, ±1%, SMD 0603; Manufacturer: YAGEO; Manufacturer Part Number: CC0603FRNPO9BN271; Package Size: 0603; JLCPCB Basic Part: No; JLCPCB Part Number: C519561; Supplier 1: LCSC; Category: Capacitors - MLCC; Supplier Part Number 1: C519561; Tolerance: ±1%; Voltage Rating: 50V; Temperature Coefficient: NP0; RoHS: Yes; ComponentLink1Description: Datasheet; ComponentLink1URL: https://wmsc.lcsc.com/wmsc/upload/file/pdf/v2/lcsc/2005141203_YAGEO-CC0603FRNPO9BN271_C519561.pdf; ComponentLink2Description: JLCPCB Part URL; ComponentLink2URL: https://jlcpcb.com/partdetail/C519561; ComponentLink3Description: LCSC Part URL; ComponentLink3URL: https://lcsc.com/product-detail/Multilayer-Ceramic-Capacitors-MLCC---SMD-SMT_YAGEO-YAGEO-CC0603FRNPO9BN271_C519561.html
footprint CAP-0603 (0603 (1608M) Capacitor)
pins: 1, 2

## CC0603FRNPO9BN300
designator C?  Capacitance: 30pF  (hidden comment: *)
Capacitor, Ceramic (MLCC), 30pF, ±1%, 50V, NP0, ±1%, SMD 0603; Manufacturer: YAGEO; Manufacturer Part Number: CC0603FRNPO9BN300; Package Size: 0603; JLCPCB Basic Part: No; JLCPCB Part Number: C519491; Supplier 1: LCSC; Category: Capacitors - MLCC; Supplier Part Number 1: C519491; Tolerance: ±1%; Voltage Rating: 50V; Temperature Coefficient: NP0; RoHS: Yes; ComponentLink1Description: Datasheet; ComponentLink1URL: https://wmsc.lcsc.com/wmsc/upload/file/pdf/v2/lcsc/2008191833_YAGEO-CC0603FRNPO9BN300_C519491.pdf; ComponentLink2Description: JLCPCB Part URL; ComponentLink2URL: https://jlcpcb.com/partdetail/C519491; ComponentLink3Description: LCSC Part URL; ComponentLink3URL: https://lcsc.com/product-detail/Multilayer-Ceramic-Capacitors-MLCC---SMD-SMT_YAGEO-YAGEO-CC0603FRNPO9BN300_C519491.html
footprint CAP-0603 (0603 (1608M) Capacitor)
pins: 1, 2

## CC0603FRNPO9BN301
designator C?  Capacitance: 300pF  (hidden comment: *)
Capacitor, Ceramic (MLCC), 300pF, ±1%, 50V, NP0, ±1%, SMD 0603; Manufacturer: YAGEO; Manufacturer Part Number: CC0603FRNPO9BN301; Package Size: 0603; JLCPCB Basic Part: No; JLCPCB Part Number: C1853096; Supplier 1: LCSC; Category: Capacitors - MLCC; Supplier Part Number 1: C1853096; Tolerance: ±1%; Voltage Rating: 50V; Temperature Coefficient: NP0; RoHS: Yes; ComponentLink1Description: Datasheet; ComponentLink1URL: https://wmsc.lcsc.com/wmsc/upload/file/pdf/v2/lcsc/2201271030_YAGEO-CC0603FRNPO9BN301_C1853096.pdf; ComponentLink2Description: JLCPCB Part URL; ComponentLink2URL: https://jlcpcb.com/partdetail/C1853096; ComponentLink3Description: LCSC Part URL; ComponentLink3URL: https://lcsc.com/product-detail/Multilayer-Ceramic-Capacitors-MLCC---SMD-SMT_YAGEO-YAGEO-CC0603FRNPO9BN301_C1853096.html
footprint CAP-0603 (0603 (1608M) Capacitor)
pins: 1, 2

## CC0603FRNPO9BN330
designator C?  Capacitance: 33pF  (hidden comment: *)
Capacitor, Ceramic (MLCC), 33pF, ±1%, 50V, NP0, ±1%, SMD 0603; Manufacturer: YAGEO; Manufacturer Part Number: CC0603FRNPO9BN330; Package Size: 0603; JLCPCB Basic Part: No; JLCPCB Part Number: C519485; Supplier 1: LCSC; Category: Capacitors - MLCC; Supplier Part Number 1: C519485; Tolerance: ±1%; Voltage Rating: 50V; Temperature Coefficient: NP0; RoHS: Yes; ComponentLink1Description: Datasheet; ComponentLink1URL: https://wmsc.lcsc.com/wmsc/upload/file/pdf/v2/lcsc/2005141203_YAGEO-CC0603FRNPO9BN330_C519485.pdf; ComponentLink2Description: JLCPCB Part URL; ComponentLink2URL: https://jlcpcb.com/partdetail/C519485; ComponentLink3Description: LCSC Part URL; ComponentLink3URL: https://lcsc.com/product-detail/Multilayer-Ceramic-Capacitors-MLCC---SMD-SMT_YAGEO-YAGEO-CC0603FRNPO9BN330_C519485.html
footprint CAP-0603 (0603 (1608M) Capacitor)
pins: 1, 2

## CC0603FRNPO9BN331
designator C?  Capacitance: 330pF  (hidden comment: *)
Capacitor, Ceramic (MLCC), 330pF, ±1%, 50V, NP0, ±1%, SMD 0603; Manufacturer: YAGEO; Manufacturer Part Number: CC0603FRNPO9BN331; Package Size: 0603; JLCPCB Basic Part: No; JLCPCB Part Number: C519562; Supplier 1: LCSC; Category: Capacitors - MLCC; Supplier Part Number 1: C519562; Tolerance: ±1%; Voltage Rating: 50V; Temperature Coefficient: NP0; RoHS: Yes; ComponentLink1Description: Datasheet; ComponentLink1URL: https://wmsc.lcsc.com/wmsc/upload/file/pdf/v2/lcsc/2007161234_YAGEO-CC0603FRNPO9BN331_C519562.pdf; ComponentLink2Description: JLCPCB Part URL; ComponentLink2URL: https://jlcpcb.com/partdetail/C519562; ComponentLink3Description: LCSC Part URL; ComponentLink3URL: https://lcsc.com/product-detail/Multilayer-Ceramic-Capacitors-MLCC---SMD-SMT_YAGEO-YAGEO-CC0603FRNPO9BN331_C519562.html
footprint CAP-0603 (0603 (1608M) Capacitor)
pins: 1, 2

## CC0603FRNPO9BN332
designator C?  Capacitance: 3.3nF  (hidden comment: *)
Capacitor, Ceramic (MLCC), 3.3nF, ±1%, 50V, NP0, ±1%, SMD 0603; Manufacturer: YAGEO; Manufacturer Part Number: CC0603FRNPO9BN332; Package Size: 0603; JLCPCB Basic Part: No; JLCPCB Part Number: C5182463; Supplier 1: LCSC; Category: Capacitors - MLCC; Supplier Part Number 1: C5182463; Tolerance: ±1%; Voltage Rating: 50V; Temperature Coefficient: NP0; RoHS: Yes; ComponentLink1Description: Datasheet; ComponentLink1URL: https://wmsc.lcsc.com/wmsc/upload/file/pdf/v2/lcsc/2311211121_YAGEO-CC0603FRNPO9BN332_C5182463.pdf; ComponentLink2Description: JLCPCB Part URL; ComponentLink2URL: https://jlcpcb.com/partdetail/C5182463; ComponentLink3Description: LCSC Part URL; ComponentLink3URL: https://lcsc.com/product-detail/Multilayer-Ceramic-Capacitors-MLCC---SMD-SMT_YAGEO-YAGEO-CC0603FRNPO9BN332_C5182463.html
footprint CAP-0603 (0603 (1608M) Capacitor)
pins: 1, 2

## CC0603FRNPO9BN360
designator C?  Capacitance: 36pF  (hidden comment: *)
Capacitor, Ceramic (MLCC), 36pF, ±1%, 50V, NP0, ±1%, SMD 0603; Manufacturer: YAGEO; Manufacturer Part Number: CC0603FRNPO9BN360; Package Size: 0603; JLCPCB Basic Part: No; JLCPCB Part Number: C519492; Supplier 1: LCSC; Category: Capacitors - MLCC; Supplier Part Number 1: C519492; Tolerance: ±1%; Voltage Rating: 50V; Temperature Coefficient: NP0; RoHS: Yes; ComponentLink1Description: Datasheet; ComponentLink1URL: https://wmsc.lcsc.com/wmsc/upload/file/pdf/v2/lcsc/2008122133_YAGEO-CC0603FRNPO9BN360_C519492.pdf; ComponentLink2Description: JLCPCB Part URL; ComponentLink2URL: https://jlcpcb.com/partdetail/C519492; ComponentLink3Description: LCSC Part URL; ComponentLink3URL: https://lcsc.com/product-detail/Multilayer-Ceramic-Capacitors-MLCC---SMD-SMT_YAGEO-YAGEO-CC0603FRNPO9BN360_C519492.html
footprint CAP-0603 (0603 (1608M) Capacitor)
pins: 1, 2

## CC0603FRNPO9BN390
designator C?  Capacitance: 39pF  (hidden comment: *)
Capacitor, Ceramic (MLCC), 39pF, ±1%, 50V, NP0, ±1%, SMD 0603; Manufacturer: YAGEO; Manufacturer Part Number: CC0603FRNPO9BN390; Package Size: 0603; JLCPCB Basic Part: No; JLCPCB Part Number: C527048; Supplier 1: LCSC; Category: Capacitors - MLCC; Supplier Part Number 1: C527048; Tolerance: ±1%; Voltage Rating: 50V; Temperature Coefficient: NP0; RoHS: Yes; ComponentLink1Description: Datasheet; ComponentLink1URL: https://wmsc.lcsc.com/wmsc/upload/file/pdf/v2/lcsc/2006181535_YAGEO-CC0603FRNPO9BN390_C527048.pdf; ComponentLink2Description: JLCPCB Part URL; ComponentLink2URL: https://jlcpcb.com/partdetail/C527048; ComponentLink3Description: LCSC Part URL; ComponentLink3URL: https://lcsc.com/product-detail/Multilayer-Ceramic-Capacitors-MLCC---SMD-SMT_YAGEO-YAGEO-CC0603FRNPO9BN390_C527048.html
footprint CAP-0603 (0603 (1608M) Capacitor)
pins: 1, 2

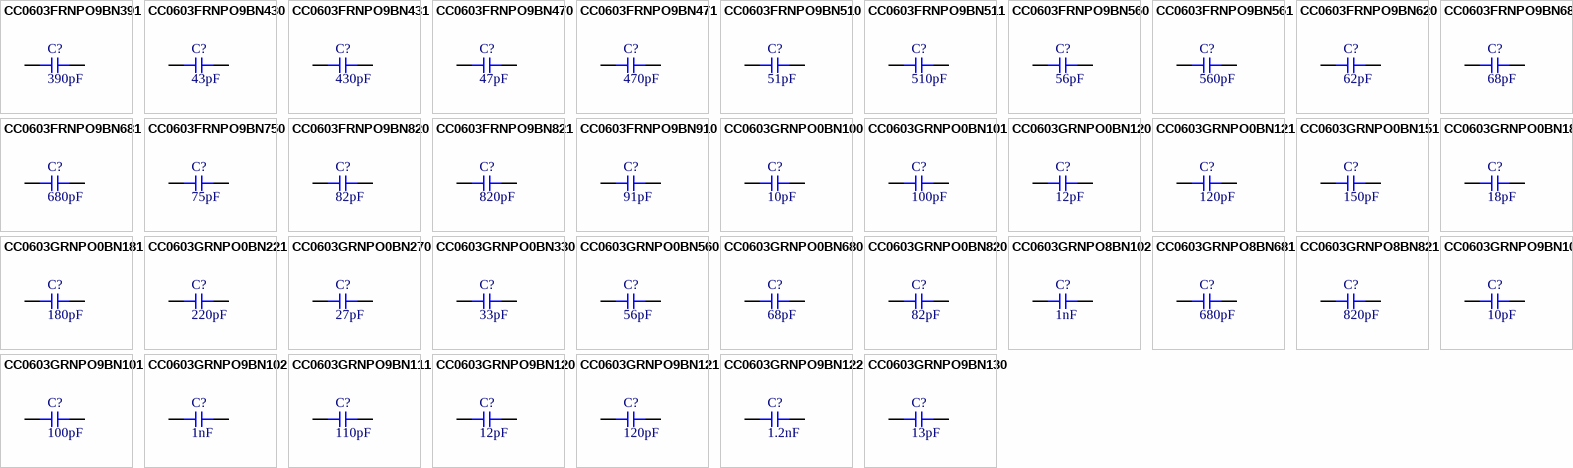
[diagram p37: symbols CC0603FRNPO9BN391 to CC0603GRNPO9BN130]

## CC0603FRNPO9BN391
designator C?  Capacitance: 390pF  (hidden comment: *)
Capacitor, Ceramic (MLCC), 390pF, ±1%, 50V, NP0, ±1%, SMD 0603; Manufacturer: YAGEO; Manufacturer Part Number: CC0603FRNPO9BN391; Package Size: 0603; JLCPCB Basic Part: No; JLCPCB Part Number: C519563; Supplier 1: LCSC; Category: Capacitors - MLCC; Supplier Part Number 1: C519563; Tolerance: ±1%; Voltage Rating: 50V; Temperature Coefficient: NP0; RoHS: Yes; ComponentLink1Description: Datasheet; ComponentLink1URL: https://wmsc.lcsc.com/wmsc/upload/file/pdf/v2/lcsc/2005141203_YAGEO-CC0603FRNPO9BN391_C519563.pdf; ComponentLink2Description: JLCPCB Part URL; ComponentLink2URL: https://jlcpcb.com/partdetail/C519563; ComponentLink3Description: LCSC Part URL; ComponentLink3URL: https://lcsc.com/product-detail/Multilayer-Ceramic-Capacitors-MLCC---SMD-SMT_YAGEO-YAGEO-CC0603FRNPO9BN391_C519563.html
footprint CAP-0603 (0603 (1608M) Capacitor)
pins: 1, 2

## CC0603FRNPO9BN430
designator C?  Capacitance: 43pF  (hidden comment: *)
Capacitor, Ceramic (MLCC), 43pF, ±1%, 50V, NP0, ±1%, SMD 0603; Manufacturer: YAGEO; Manufacturer Part Number: CC0603FRNPO9BN430; Package Size: 0603; JLCPCB Basic Part: No; JLCPCB Part Number: C519493; Supplier 1: LCSC; Category: Capacitors - MLCC; Supplier Part Number 1: C519493; Tolerance: ±1%; Voltage Rating: 50V; Temperature Coefficient: NP0; RoHS: Yes; ComponentLink1Description: Datasheet; ComponentLink1URL: https://wmsc.lcsc.com/wmsc/upload/file/pdf/v2/lcsc/2007161234_YAGEO-CC0603FRNPO9BN430_C519493.pdf; ComponentLink2Description: JLCPCB Part URL; ComponentLink2URL: https://jlcpcb.com/partdetail/C519493; ComponentLink3Description: LCSC Part URL; ComponentLink3URL: https://lcsc.com/product-detail/Multilayer-Ceramic-Capacitors-MLCC---SMD-SMT_YAGEO-YAGEO-CC0603FRNPO9BN430_C519493.html
footprint CAP-0603 (0603 (1608M) Capacitor)
pins: 1, 2

## CC0603FRNPO9BN431
designator C?  Capacitance: 430pF  (hidden comment: *)
Capacitor, Ceramic (MLCC), 430pF, ±1%, 50V, NP0, ±1%, SMD 0603; Manufacturer: YAGEO; Manufacturer Part Number: CC0603FRNPO9BN431; Package Size: 0603; JLCPCB Basic Part: No; JLCPCB Part Number: C519571; Supplier 1: LCSC; Category: Capacitors - MLCC; Supplier Part Number 1: C519571; Tolerance: ±1%; Voltage Rating: 50V; Temperature Coefficient: NP0; RoHS: Yes; ComponentLink1Description: Datasheet; ComponentLink1URL: https://wmsc.lcsc.com/wmsc/upload/file/pdf/v2/lcsc/2006011835_YAGEO-CC0603FRNPO9BN431_C519571.pdf; ComponentLink2Description: JLCPCB Part URL; ComponentLink2URL: https://jlcpcb.com/partdetail/C519571; ComponentLink3Description: LCSC Part URL; ComponentLink3URL: https://lcsc.com/product-detail/Multilayer-Ceramic-Capacitors-MLCC---SMD-SMT_YAGEO-YAGEO-CC0603FRNPO9BN431_C519571.html
footprint CAP-0603 (0603 (1608M) Capacitor)
pins: 1, 2